# Altium schematic symbol library IC_ADI.SCHLIB: 3169 symbols (part 137 of 181) (continued)
## AD9238BCPZ-65 (continued)

## AD9238BSTZ-20
designator U?
Dual 12-Bit Analog-to-Digital Converter with Parallel Interface, 20MSPS, -40 to +85 degC, ST-64-1, Pb-Free, Tray; Generic Part Number: AD9238-20; PartNumber: AD9238BSTZ-20; Resolution (Bits): 12; Channels: 2; Throughput Rate (SPS): 20M; Interface: Par; DatasheetVersion: Rev.C; PackageVersion: 051706-A; PackageReference: ST-64-1; PackageDescription: 64-Lead Low Profile Quad Flat Package [LQFP]; Supplier Part Number 1: AD9238BSTZ-20-ND; Supplier Part Number 2: 59K7212; Supplier Part Number 3: 584-AD9238BSTZ-20; RoHS: Y; Packing: Tray; Mounting Technology: Surface Mount; Code_JEDEC: MS-026-BBD; ComponentLink1Description: Manufacturer URL; ComponentLink2Description: Datasheet; ComponentLink3Description: Package Specification; ComponentLink4Description: Product URL
footprint LQFP64_0.4MM(10X10) (Footprint not found)
part A pins: 2 VIN+_A (in) "Analog Input Pin (+) for Channel A.", 3 VIN-_A (in) "Analog Input Pin (-) for Channel A.", 6 REFT_A "Differential Reference (+) for Channel A.", 7 REFB_A "Differential Reference (-) for Channel A.", 8 VREF (io) "Voltage Reference Input/Output.", 9 SENSE (in) "Reference Mode Selection.", 10 REFB_B "Differential Reference (-) for Channel B.", 11 REFT_B "Differential Reference (+) for Channel B.", 14 VIN-_B (in) "Analog Input Pin (-) for Channel B.", 15 VIN+_B (in) "Analog Input Pin (+) for Channel B.", 18 CLK_B (in) "Clock Input Pin for Channel B.", 19 DCS (in) "Enable Duty Cycle Stabilizer (DCS) Mode (Tie High to Enable).", 20 DFS (in) "Data Output Format Select Bit (Low for Offset Binary, High for Twos Complement).", 21 PDWN_B (in) "Power-Down Function Selection for Channel B:  Logic 0 enables Channel B.  Logic 1 powers down Channel B. (Outputs static, not High-Z.)", 22 OEB_B (in) "Output Enable Bit for Channel B:  Logic 0 enables Data Bus B.  Logic 1 sets outputs to High-Z.", 23 DNC "Do Not Connect Pins. Should be left floating.", 24 DNC "Do Not Connect Pins. Should be left floating.", 25 D0_B (LSB) (hiz) "Channel B Data Output Bits.", 26 D1_B (hiz) "Channel B Data Output Bits.", 27 D2_B (hiz) "Channel B Data Output Bits.", 30 D3_B (hiz) "Channel B Data Output Bits.", 31 D4_B (hiz) "Channel B Data Output Bits.", 32 D5_B (hiz) "Channel B Data Output Bits.", 33 D6_B (hiz) "Channel B Data Output Bits.", 34 D7_B (hiz) "Channel B Data Output Bits.", 35 D8_B (hiz) "Channel B Data Output Bits.", 36 D9_B (hiz) "Channel B Data Output Bits.", 37 D10_B (hiz) "Channel A Data Output Bits.", 38 D11_B (MSB) (hiz) "Channel A Data Output Bits.", 39 OTR_B (hiz) "Out-of-Range Indicator for Channel B.", 42 DNC "Do Not Connect Pins. Should be left floating.", 43 DNC "Do Not Connect Pins. Should be left floating.", 44 D0_A (LSB) (hiz) "Channel A Data Output Bits.", 45 D1_A (hiz) "Channel A Data Output Bits.", 46 D2_A (hiz) "Channel A Data Output Bits.", 47 D3_A (hiz) "Channel A Data Output Bits.", 48 D4_A (hiz) "Channel A Data Output Bits.", 49 D5_A (hiz) "Channel A Data Output Bits.", 50 D6_A (hiz) "Channel A Data Output Bits.", 51 D7_A (hiz) "Channel A Data Output Bits.", 54 D8_A (hiz) "Channel A Data Output Bits.", 55 D9_A (hiz) "Channel A Data Output Bits.", 56 D10_A (hiz) "Channel A Data Output Bits.", 57 D11_A (MSB) (hiz) "Channel A Data Output Bits.", 58 OTR_A (hiz) "Out-of-Range Indicator for Channel A.", 59 OEB_A (in) "Output Enable Bit for Channel A:  Logic 0 enables Data Bus A.  Logic 1 sets outputs to High-Z.", 60 PDWN_A (in) "Power-Down Function Selection for Channel A:  Logic 0 enables Channel A.  Logic 1 powers down Channel A. (Outputs static, not High-Z.)", 61 MUX_SELECT (in) "Data Multiplexed Mode. (See Data Format section for how to enable; high setting disables  output data multiplexed mode).", 62 SHARED_REF (in) "Shared Reference Control Bit (Low for Independent Reference Mode, High for Shared Reference Mode).", 63 CLK_A (in) "Clock Input Pin for Channel A."
part B pins: 1 AGND (power) "Analog Ground.", 4 AGND (power) "Analog Ground.", 5 AVDD (power) "Analog Power Supply.", 12 AVDD (power) "Analog Power Supply.", 13 AGND (power) "Analog Ground.", 16 AGND (power) "Analog Ground.", 17 AVDD (power) "Analog Power Supply.", 28 DRGND (power) "Digital Output Ground.", 29 DRVDD (power) "Digital Output Driver Supply. Must be decoupled to DRGND with a minimum 0.1 uF capacitor.  Recommended decoupling is 0.1 uF capacitor in parallel with 10 uF.", 40 DRGND (power) "Digital Output Ground.", 41 DRVDD (power) "Digital Output Driver Supply. Must be decoupled to DRGND with a minimum 0.1 uF capacitor.  Recommended decoupling is 0.1 uF capacitor in parallel with 10 uF.", 52 DRVDD (power) "Digital Output Driver Supply. Must be decoupled to DRGND with a minimum 0.1 uF capacitor.   Recommended decoupling is 0.1 uF capacitor in parallel with 10 uF.", 53 DRGND (power) "Digital Output Ground.", 64 AVDD (power) "Analog Power Supply."

## AD9238BSTZ-40
designator U?
Dual 12-Bit Analog-to-Digital Converter with Parallel Interface, 40MSPS, -40 to +85 degC, ST-64-1, Pb-Free, Tray; Generic Part Number: AD9238-40; PartNumber: AD9238BSTZ-40; Resolution (Bits): 12; Channels: 2; Throughput Rate (SPS): 40M; Interface: Par; DatasheetVersion: Rev.C; PackageVersion: 051706-A; PackageReference: ST-64-1; PackageDescription: 64-Lead Low Profile Quad Flat Package [LQFP]; Supplier Part Number 1: AD9238BSTZ-40-ND; Supplier Part Number 2: 1438562; Supplier Part Number 3: 59K7214; Supplier Part Number 4: 584-AD9238BSTZ-40; RoHS: Y; Packing: Tray; Mounting Technology: Surface Mount; Code_JEDEC: MS-026-BBD; ComponentLink1Description: Manufacturer URL; ComponentLink2Description: Datasheet; ComponentLink3Description: Package Specification; ComponentLink4Description: Product URL
footprint LQFP64_0.4MM(10X10) (Footprint not found)
part A pins: 2 VIN+_A (in) "Analog Input Pin (+) for Channel A.", 3 VIN-_A (in) "Analog Input Pin (-) for Channel A.", 14 VIN-_B (in) "Analog Input Pin (-) for Channel B.", 15 VIN+_B (in) "Analog Input Pin (+) for Channel B.", 22 OEB_B (in) "Output Enable Bit for Channel B:  Logic 0 enables Data Bus B.  Logic 1 sets outputs to High-Z.", 25 D0_B (LSB) (hiz) "Channel B Data Output Bits.", 26 D1_B (hiz) "Channel B Data Output Bits.", 27 D2_B (hiz) "Channel B Data Output Bits.", 30 D3_B (hiz) "Channel B Data Output Bits.", 31 D4_B (hiz) "Channel B Data Output Bits.", 32 D5_B (hiz) "Channel B Data Output Bits.", 33 D6_B (hiz) "Channel B Data Output Bits.", 34 D7_B (hiz) "Channel B Data Output Bits.", 35 D8_B (hiz) "Channel B Data Output Bits.", 36 D9_B (hiz) "Channel B Data Output Bits.", 37 D10_B (hiz) "Channel A Data Output Bits.", 38 D11_B (MSB) (hiz) "Channel A Data Output Bits.", 39 OTR_B (hiz) "Out-of-Range Indicator for Channel B.", 44 D0_A (LSB) (hiz) "Channel A Data Output Bits.", 45 D1_A (hiz) "Channel A Data Output Bits.", 46 D2_A (hiz) "Channel A Data Output Bits.", 47 D3_A (hiz) "Channel A Data Output Bits.", 48 D4_A (hiz) "Channel A Data Output Bits.", 49 D5_A (hiz) "Channel A Data Output Bits.", 50 D6_A (hiz) "Channel A Data Output Bits.", 51 D7_A (hiz) "Channel A Data Output Bits.", 54 D8_A (hiz) "Channel A Data Output Bits.", 55 D9_A (hiz) "Channel A Data Output Bits.", 56 D10_A (hiz) "Channel A Data Output Bits.", 57 D11_A (MSB) (hiz) "Channel A Data Output Bits.", 58 OTR_A (hiz) "Out-of-Range Indicator for Channel A.", 59 OEB_A (in) "Output Enable Bit for Channel A:  Logic 0 enables Data Bus A.  Logic 1 sets outputs to High-Z."
part B pins: 6 REFT_A "Differential Reference (+) for Channel A.", 7 REFB_A "Differential Reference (-) for Channel A.", 8 VREF (io) "Voltage Reference Input/Output.", 9 SENSE (in) "Reference Mode Selection.", 10 REFB_B "Differential Reference (-) for Channel B.", 11 REFT_B "Differential Reference (+) for Channel B.", 18 CLK_B (in) "Clock Input Pin for Channel B.", 19 DCS (in) "Enable Duty Cycle Stabilizer (DCS) Mode (Tie High to Enable).", 20 DFS (in) "Data Output Format Select Bit (Low for Offset Binary, High for Twos Complement).", 21 PDWN_B (in) "Power-Down Function Selection for Channel B:  Logic 0 enables Channel B.  Logic 1 powers down Channel B. (Outputs static, not High-Z.)", 23 DNC "Do Not Connect Pins. Should be left floating.", 24 DNC "Do Not Connect Pins. Should be left floating.", 42 DNC "Do Not Connect Pins. Should be left floating.", 43 DNC "Do Not Connect Pins. Should be left floating.", 60 PDWN_A (in) "Power-Down Function Selection for Channel A:  Logic 0 enables Channel A.  Logic 1 powers down Channel A. (Outputs static, not High-Z.)", 61 MUX_SELECT (in) "Data Multiplexed Mode. (See Data Format section for how to enable; high setting disables  output data multiplexed mode).", 62 SHARED_REF (in) "Shared Reference Control Bit (Low for Independent Reference Mode, High for Shared Reference Mode).", 63 CLK_A (in) "Clock Input Pin for Channel A."
part C pins: 1 AGND (power) "Analog Ground.", 4 AGND (power) "Analog Ground.", 5 AVDD (power) "Analog Power Supply.", 12 AVDD (power) "Analog Power Supply.", 13 AGND (power) "Analog Ground.", 16 AGND (power) "Analog Ground.", 17 AVDD (power) "Analog Power Supply.", 28 DRGND (power) "Digital Output Ground.", 29 DRVDD (power) "Digital Output Driver Supply. Must be decoupled to DRGND with a minimum 0.1 礔 capacitor.  Recommended decoupling is 0.1 礔 capacitor in parallel with 10 礔.", 40 DRGND (power) "Digital Output Ground.", 41 DRVDD (power) "Digital Output Driver Supply. Must be decoupled to DRGND with a minimum 0.1 礔 capacitor.  Recommended decoupling is 0.1 礔 capacitor in parallel with 10 礔.", 52 DRVDD (power) "Digital Output Driver Supply. Must be decoupled to DRGND with a minimum 0.1 礔 capacitor.   Recommended decoupling is 0.1 礔 capacitor in parallel with 10 礔.", 53 DRGND (power) "Digital Output Ground.", 64 AVDD (power) "Analog Power Supply."

## AD9238BSTZ-65
designator U?
Dual 12-Bit Analog-to-Digital Converter with Parallel Interface, 65MSPS, -40 to +85 degC, ST-64-1, Pb-Free, Tray; Generic Part Number: AD9238-65; PartNumber: AD9238BSTZ-65; Resolution (Bits): 12; Channels: 2; Throughput Rate (SPS): 65M; Interface: Par; DatasheetVersion: Rev.C; PackageVersion: 051706-A; PackageReference: ST-64-1; PackageDescription: 64-Lead Low Profile Quad Flat Package [LQFP]; Supplier Part Number 1: AD9238BSTZ-65-ND; Supplier Part Number 2: 1581964; Supplier Part Number 3: 59K7216; Supplier Part Number 4: 584-AD9238BSTZ-65; RoHS: Y; Packing: Tray; Mounting Technology: Surface Mount; Code_JEDEC: MS-026-BBD; ComponentLink1Description: Manufacturer URL; ComponentLink2Description: Datasheet; ComponentLink3Description: Package Specification; ComponentLink4Description: Product URL
footprint LQFP64_0.4MM(10X10) (Footprint not found)
part A pins: 2 VIN+_A (in) "Analog Input Pin (+) for Channel A.", 3 VIN-_A (in) "Analog Input Pin (-) for Channel A.", 14 VIN-_B (in) "Analog Input Pin (-) for Channel B.", 15 VIN+_B (in) "Analog Input Pin (+) for Channel B.", 22 OEB_B (in) "Output Enable Bit for Channel B:  Logic 0 enables Data Bus B.  Logic 1 sets outputs to High-Z.", 25 D0_B (LSB) (hiz) "Channel B Data Output Bits.", 26 D1_B (hiz) "Channel B Data Output Bits.", 27 D2_B (hiz) "Channel B Data Output Bits.", 30 D3_B (hiz) "Channel B Data Output Bits.", 31 D4_B (hiz) "Channel B Data Output Bits.", 32 D5_B (hiz) "Channel B Data Output Bits.", 33 D6_B (hiz) "Channel B Data Output Bits.", 34 D7_B (hiz) "Channel B Data Output Bits.", 35 D8_B (hiz) "Channel B Data Output Bits.", 36 D9_B (hiz) "Channel B Data Output Bits.", 37 D10_B (hiz) "Channel A Data Output Bits.", 38 D11_B (MSB) (hiz) "Channel A Data Output Bits.", 39 OTR_B (hiz) "Out-of-Range Indicator for Channel B.", 44 D0_A (LSB) (hiz) "Channel A Data Output Bits.", 45 D1_A (hiz) "Channel A Data Output Bits.", 46 D2_A (hiz) "Channel A Data Output Bits.", 47 D3_A (hiz) "Channel A Data Output Bits.", 48 D4_A (hiz) "Channel A Data Output Bits.", 49 D5_A (hiz) "Channel A Data Output Bits.", 50 D6_A (hiz) "Channel A Data Output Bits.", 51 D7_A (hiz) "Channel A Data Output Bits.", 54 D8_A (hiz) "Channel A Data Output Bits.", 55 D9_A (hiz) "Channel A Data Output Bits.", 56 D10_A (hiz) "Channel A Data Output Bits.", 57 D11_A (MSB) (hiz) "Channel A Data Output Bits.", 58 OTR_A (hiz) "Out-of-Range Indicator for Channel A.", 59 OEB_A (in) "Output Enable Bit for Channel A:  Logic 0 enables Data Bus A.  Logic 1 sets outputs to High-Z."
part B pins: 1 AGND (power) "Analog Ground.", 4 AGND (power) "Analog Ground.", 5 AVDD (power) "Analog Power Supply.", 6 REFT_A "Differential Reference (+) for Channel A.", 7 REFB_A "Differential Reference (-) for Channel A.", 8 VREF (io) "Voltage Reference Input/Output.", 9 SENSE (in) "Reference Mode Selection.", 10 REFB_B "Differential Reference (-) for Channel B.", 11 REFT_B "Differential Reference (+) for Channel B.", 12 AVDD (power) "Analog Power Supply.", 13 AGND (power) "Analog Ground.", 16 AGND (power) "Analog Ground.", 17 AVDD (power) "Analog Power Supply.", 18 CLK_B (in) "Clock Input Pin for Channel B.", 19 DCS (in) "Enable Duty Cycle Stabilizer (DCS) Mode (Tie High to Enable).", 20 DFS (in) "Data Output Format Select Bit (Low for Offset Binary, High for Twos Complement).", 21 PDWN_B (in) "Power-Down Function Selection for Channel B:  Logic 0 enables Channel B.  Logic 1 powers down Channel B. (Outputs static, not High-Z.)", 23 DNC "Do Not Connect Pins. Should be left floating.", 24 DNC "Do Not Connect Pins. Should be left floating.", 28 DRGND (power) "Digital Output Ground.", 29 DRVDD (power) "Digital Output Driver Supply. Must be decoupled to DRGND with a minimum 0.1 礔 capacitor.  Recommended decoupling is 0.1 礔 capacitor in parallel with 10 礔.", 40 DRGND (power) "Digital Output Ground.", 41 DRVDD (power) "Digital Output Driver Supply. Must be decoupled to DRGND with a minimum 0.1 礔 capacitor.  Recommended decoupling is 0.1 礔 capacitor in parallel with 10 礔.", 42 DNC "Do Not Connect Pins. Should be left floating.", 43 DNC "Do Not Connect Pins. Should be left floating.", 52 DRVDD (power) "Digital Output Driver Supply. Must be decoupled to DRGND with a minimum 0.1 礔 capacitor.   Recommended decoupling is 0.1 礔 capacitor in parallel with 10 礔.", 53 DRGND (power) "Digital Output Ground.", 60 PDWN_A (in) "Power-Down Function Selection for Channel A:  Logic 0 enables Channel A.  Logic 1 powers down Channel A. (Outputs static, not High-Z.)", 61 MUX_SELECT (in) "Data Multiplexed Mode. (See Data Format section for how to enable; high setting disables  output data multiplexed mode).", 62 SHARED_REF (in) "Shared Reference Control Bit (Low for Independent Reference Mode, High for Shared Reference Mode).", 63 CLK_A (in) "Clock Input Pin for Channel A.", 64 AVDD (power) "Analog Power Supply."

## AD9238BSTZRL-20
designator U?
Dual 12-Bit Analog-to-Digital Converter with Parallel Interface, 20MSPS, -40 to +85 degC, ST-64-1, Pb-Free, Reel; Generic Part Number: AD9238-20; PartNumber: AD9238BSTZRL-20; Resolution (Bits): 12; Channels: 2; Throughput Rate (SPS): 20M; Interface: Par; DatasheetVersion: Rev.C; PackageVersion: 051706-A; PackageReference: ST-64-1; PackageDescription: 64-Lead Low Profile Quad Flat Package [LQFP]; Supplier Part Number 1: AD9238BSTZRL-20-ND; Supplier Part Number 2: 584-AD9238BSTZR-20; RoHS: Y; Packing: Reel; Mounting Technology: Surface Mount; Code_JEDEC: MS-026-BBD; ComponentLink1Description: Manufacturer URL; ComponentLink2Description: Datasheet; ComponentLink3Description: Package Specification; ComponentLink4Description: Product URL
footprint LQFP64_0.4MM(10X10) (Footprint not found)
part A pins: 2 VIN+_A (in) "Analog Input Pin (+) for Channel A.", 3 VIN-_A (in) "Analog Input Pin (-) for Channel A.", 6 REFT_A "Differential Reference (+) for Channel A.", 7 REFB_A "Differential Reference (-) for Channel A.", 8 VREF (io) "Voltage Reference Input/Output.", 9 SENSE (in) "Reference Mode Selection.", 10 REFB_B "Differential Reference (-) for Channel B.", 11 REFT_B "Differential Reference (+) for Channel B.", 14 VIN-_B (in) "Analog Input Pin (-) for Channel B.", 15 VIN+_B (in) "Analog Input Pin (+) for Channel B.", 18 CLK_B (in) "Clock Input Pin for Channel B.", 19 DCS (in) "Enable Duty Cycle Stabilizer (DCS) Mode (Tie High to Enable).", 20 DFS (in) "Data Output Format Select Bit (Low for Offset Binary, High for Twos Complement).", 21 PDWN_B (in) "Power-Down Function Selection for Channel B:  Logic 0 enables Channel B.  Logic 1 powers down Channel B. (Outputs static, not High-Z.)", 22 OEB_B (in) "Output Enable Bit for Channel B:  Logic 0 enables Data Bus B.  Logic 1 sets outputs to High-Z.", 23 DNC "Do Not Connect Pins. Should be left floating.", 24 DNC "Do Not Connect Pins. Should be left floating.", 25 D0_B (LSB) (hiz) "Channel B Data Output Bits.", 26 D1_B (hiz) "Channel B Data Output Bits.", 27 D2_B (hiz) "Channel B Data Output Bits.", 30 D3_B (hiz) "Channel B Data Output Bits.", 31 D4_B (hiz) "Channel B Data Output Bits.", 32 D5_B (hiz) "Channel B Data Output Bits.", 33 D6_B (hiz) "Channel B Data Output Bits.", 34 D7_B (hiz) "Channel B Data Output Bits.", 35 D8_B (hiz) "Channel B Data Output Bits.", 36 D9_B (hiz) "Channel B Data Output Bits.", 37 D10_B (hiz) "Channel A Data Output Bits.", 38 D11_B (MSB) (hiz) "Channel A Data Output Bits.", 39 OTR_B (hiz) "Out-of-Range Indicator for Channel B.", 42 DNC "Do Not Connect Pins. Should be left floating.", 43 DNC "Do Not Connect Pins. Should be left floating.", 44 D0_A (LSB) (hiz) "Channel A Data Output Bits.", 45 D1_A (hiz) "Channel A Data Output Bits.", 46 D2_A (hiz) "Channel A Data Output Bits.", 47 D3_A (hiz) "Channel A Data Output Bits.", 48 D4_A (hiz) "Channel A Data Output Bits.", 49 D5_A (hiz) "Channel A Data Output Bits.", 50 D6_A (hiz) "Channel A Data Output Bits.", 51 D7_A (hiz) "Channel A Data Output Bits.", 54 D8_A (hiz) "Channel A Data Output Bits.", 55 D9_A (hiz) "Channel A Data Output Bits.", 56 D10_A (hiz) "Channel A Data Output Bits.", 57 D11_A (MSB) (hiz) "Channel A Data Output Bits.", 58 OTR_A (hiz) "Out-of-Range Indicator for Channel A.", 59 OEB_A (in) "Output Enable Bit for Channel A:  Logic 0 enables Data Bus A.  Logic 1 sets outputs to High-Z.", 60 PDWN_A (in) "Power-Down Function Selection for Channel A:  Logic 0 enables Channel A.  Logic 1 powers down Channel A. (Outputs static, not High-Z.)", 61 MUX_SELECT (in) "Data Multiplexed Mode. (See Data Format section for how to enable; high setting disables  output data multiplexed mode).", 62 SHARED_REF (in) "Shared Reference Control Bit (Low for Independent Reference Mode, High for Shared Reference Mode).", 63 CLK_A (in) "Clock Input Pin for Channel A."
part B pins: 1 AGND (power) "Analog Ground.", 4 AGND (power) "Analog Ground.", 5 AVDD (power) "Analog Power Supply.", 12 AVDD (power) "Analog Power Supply.", 13 AGND (power) "Analog Ground.", 16 AGND (power) "Analog Ground.", 17 AVDD (power) "Analog Power Supply.", 28 DRGND (power) "Digital Output Ground.", 29 DRVDD (power) "Digital Output Driver Supply. Must be decoupled to DRGND with a minimum 0.1 uF capacitor.  Recommended decoupling is 0.1 uF capacitor in parallel with 10 uF.", 40 DRGND (power) "Digital Output Ground.", 41 DRVDD (power) "Digital Output Driver Supply. Must be decoupled to DRGND with a minimum 0.1 uF capacitor.  Recommended decoupling is 0.1 uF capacitor in parallel with 10 uF.", 52 DRVDD (power) "Digital Output Driver Supply. Must be decoupled to DRGND with a minimum 0.1 uF capacitor.   Recommended decoupling is 0.1 uF capacitor in parallel with 10 uF.", 53 DRGND (power) "Digital Output Ground.", 64 AVDD (power) "Analog Power Supply."

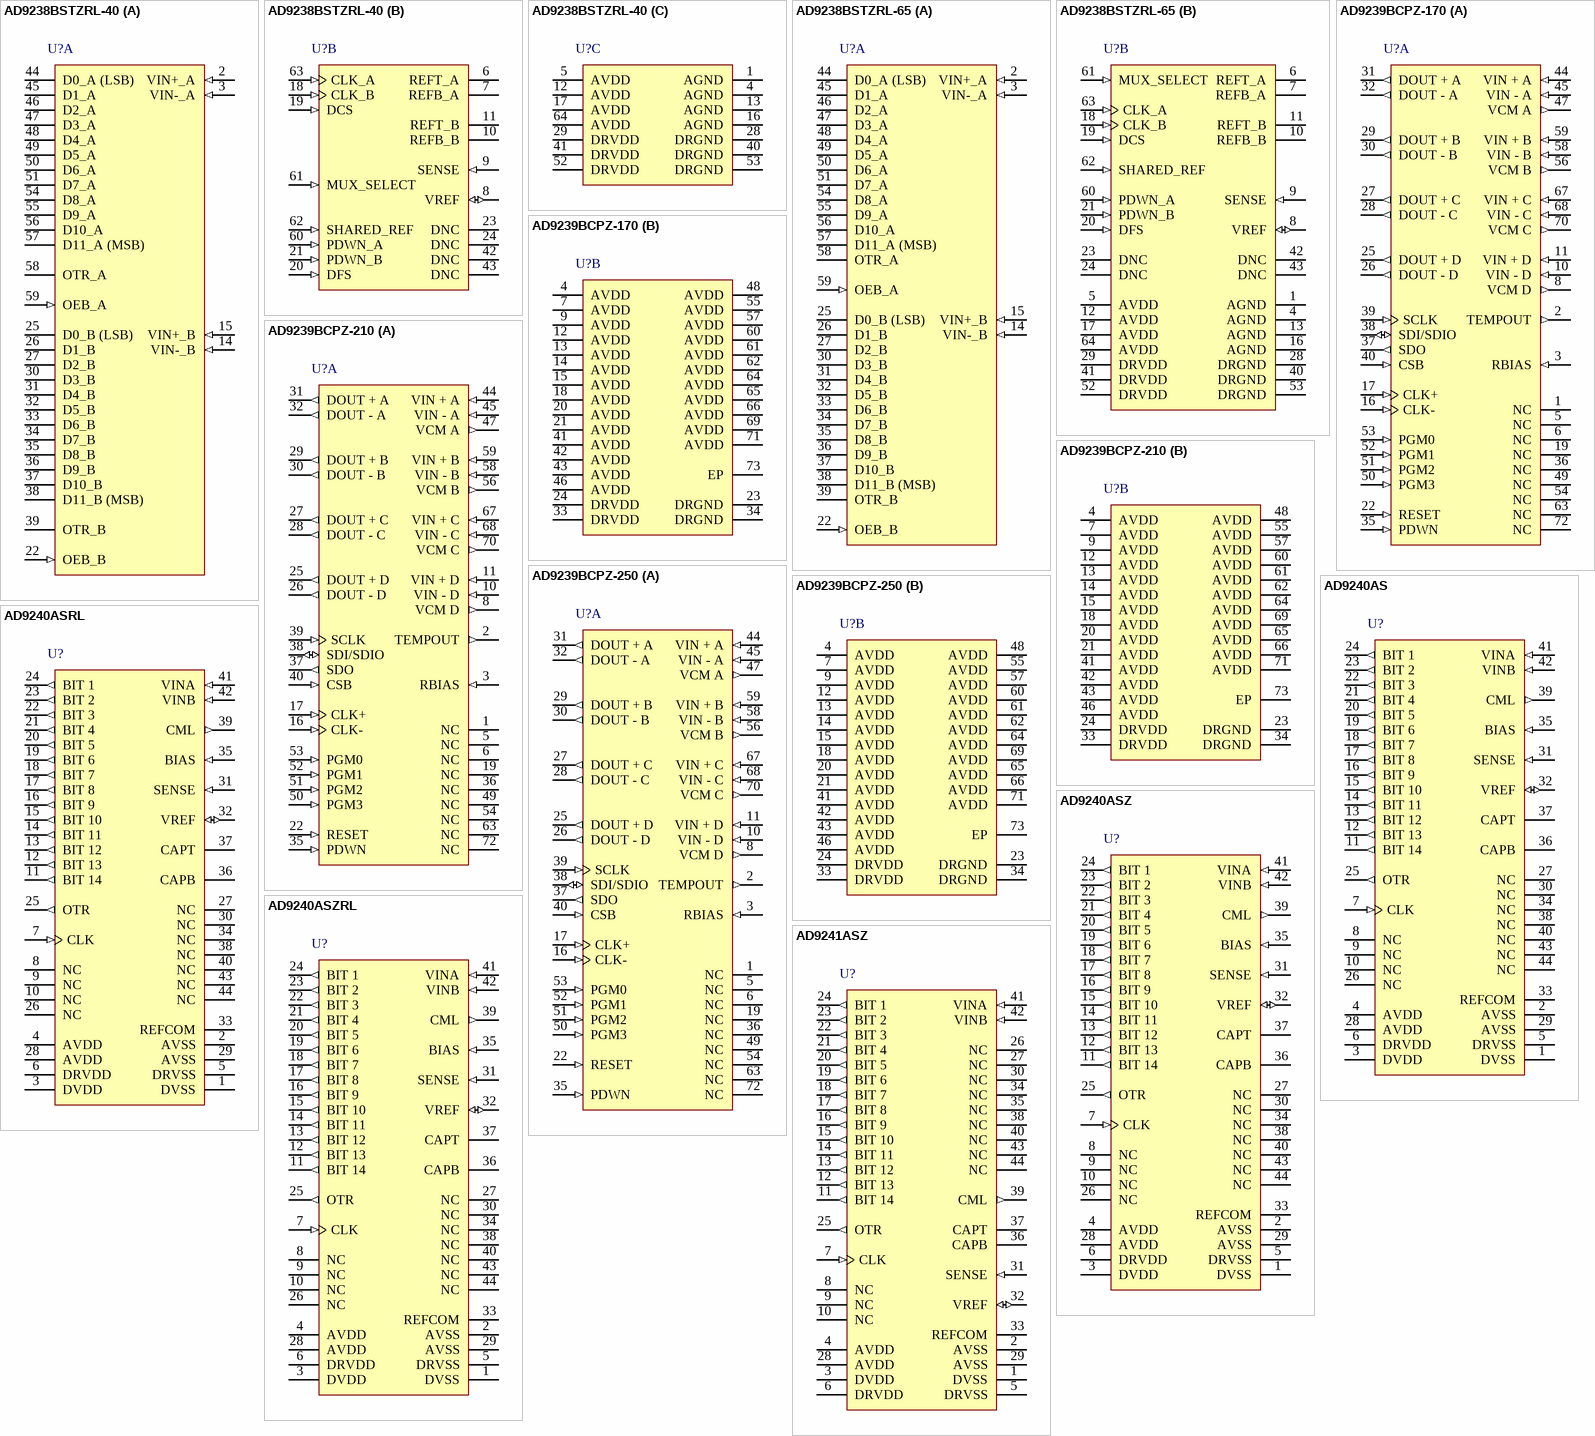
[diagram p113: symbols AD9238BSTZRL-40 to AD9241ASZ]

## AD9238BSTZRL-40
designator U?
Dual 12-Bit Analog-to-Digital Converter with Parallel Interface, 40MSPS, -40 to +85 degC, ST-64-1, Pb-Free,Reel; Generic Part Number: AD9238-40; PartNumber: AD9238BSTZRL-40; Resolution (Bits): 12; Channels: 2; Throughput Rate (SPS): 40M; Interface: Par; DatasheetVersion: Rev.C; PackageVersion: 051706-A; PackageReference: ST-64-1; PackageDescription: 64-Lead Low Profile Quad Flat Package [LQFP]; Supplier Part Number 1: AD9238BSTZRL-40-ND; Supplier Part Number 2: 584-AD9238BSTZR-40; RoHS: Y; Packing: Reel; Mounting Technology: Surface Mount; Code_JEDEC: MS-026-BBD; ComponentLink1Description: Manufacturer URL; ComponentLink2Description: Datasheet; ComponentLink3Description: Package Specification; ComponentLink4Description: Product URL
footprint LQFP64_0.4MM(10X10) (Footprint not found)
part A pins: 2 VIN+_A (in) "Analog Input Pin (+) for Channel A.", 3 VIN-_A (in) "Analog Input Pin (-) for Channel A.", 14 VIN-_B (in) "Analog Input Pin (-) for Channel B.", 15 VIN+_B (in) "Analog Input Pin (+) for Channel B.", 22 OEB_B (in) "Output Enable Bit for Channel B:  Logic 0 enables Data Bus B.  Logic 1 sets outputs to High-Z.", 25 D0_B (LSB) (hiz) "Channel B Data Output Bits.", 26 D1_B (hiz) "Channel B Data Output Bits.", 27 D2_B (hiz) "Channel B Data Output Bits.", 30 D3_B (hiz) "Channel B Data Output Bits.", 31 D4_B (hiz) "Channel B Data Output Bits.", 32 D5_B (hiz) "Channel B Data Output Bits.", 33 D6_B (hiz) "Channel B Data Output Bits.", 34 D7_B (hiz) "Channel B Data Output Bits.", 35 D8_B (hiz) "Channel B Data Output Bits.", 36 D9_B (hiz) "Channel B Data Output Bits.", 37 D10_B (hiz) "Channel A Data Output Bits.", 38 D11_B (MSB) (hiz) "Channel A Data Output Bits.", 39 OTR_B (hiz) "Out-of-Range Indicator for Channel B.", 44 D0_A (LSB) (hiz) "Channel A Data Output Bits.", 45 D1_A (hiz) "Channel A Data Output Bits.", 46 D2_A (hiz) "Channel A Data Output Bits.", 47 D3_A (hiz) "Channel A Data Output Bits.", 48 D4_A (hiz) "Channel A Data Output Bits.", 49 D5_A (hiz) "Channel A Data Output Bits.", 50 D6_A (hiz) "Channel A Data Output Bits.", 51 D7_A (hiz) "Channel A Data Output Bits.", 54 D8_A (hiz) "Channel A Data Output Bits.", 55 D9_A (hiz) "Channel A Data Output Bits.", 56 D10_A (hiz) "Channel A Data Output Bits.", 57 D11_A (MSB) (hiz) "Channel A Data Output Bits.", 58 OTR_A (hiz) "Out-of-Range Indicator for Channel A.", 59 OEB_A (in) "Output Enable Bit for Channel A:  Logic 0 enables Data Bus A.  Logic 1 sets outputs to High-Z."
part B pins: 6 REFT_A "Differential Reference (+) for Channel A.", 7 REFB_A "Differential Reference (-) for Channel A.", 8 VREF (io) "Voltage Reference Input/Output.", 9 SENSE (in) "Reference Mode Selection.", 10 REFB_B "Differential Reference (-) for Channel B.", 11 REFT_B "Differential Reference (+) for Channel B.", 18 CLK_B (in) "Clock Input Pin for Channel B.", 19 DCS (in) "Enable Duty Cycle Stabilizer (DCS) Mode (Tie High to Enable).", 20 DFS (in) "Data Output Format Select Bit (Low for Offset Binary, High for Twos Complement).", 21 PDWN_B (in) "Power-Down Function Selection for Channel B:  Logic 0 enables Channel B.  Logic 1 powers down Channel B. (Outputs static, not High-Z.)", 23 DNC "Do Not Connect Pins. Should be left floating.", 24 DNC "Do Not Connect Pins. Should be left floating.", 42 DNC "Do Not Connect Pins. Should be left floating.", 43 DNC "Do Not Connect Pins. Should be left floating.", 60 PDWN_A (in) "Power-Down Function Selection for Channel A:  Logic 0 enables Channel A.  Logic 1 powers down Channel A. (Outputs static, not High-Z.)", 61 MUX_SELECT (in) "Data Multiplexed Mode. (See Data Format section for how to enable; high setting disables  output data multiplexed mode).", 62 SHARED_REF (in) "Shared Reference Control Bit (Low for Independent Reference Mode, High for Shared Reference Mode).", 63 CLK_A (in) "Clock Input Pin for Channel A."
part C pins: 1 AGND (power) "Analog Ground.", 4 AGND (power) "Analog Ground.", 5 AVDD (power) "Analog Power Supply.", 12 AVDD (power) "Analog Power Supply.", 13 AGND (power) "Analog Ground.", 16 AGND (power) "Analog Ground.", 17 AVDD (power) "Analog Power Supply.", 28 DRGND (power) "Digital Output Ground.", 29 DRVDD (power) "Digital Output Driver Supply. Must be decoupled to DRGND with a minimum 0.1 礔 capacitor.  Recommended decoupling is 0.1 礔 capacitor in parallel with 10 礔.", 40 DRGND (power) "Digital Output Ground.", 41 DRVDD (power) "Digital Output Driver Supply. Must be decoupled to DRGND with a minimum 0.1 礔 capacitor.  Recommended decoupling is 0.1 礔 capacitor in parallel with 10 礔.", 52 DRVDD (power) "Digital Output Driver Supply. Must be decoupled to DRGND with a minimum 0.1 礔 capacitor.   Recommended decoupling is 0.1 礔 capacitor in parallel with 10 礔.", 53 DRGND (power) "Digital Output Ground.", 64 AVDD (power) "Analog Power Supply."

## AD9238BSTZRL-65
designator U?
Dual 12-Bit Analog-to-Digital Converter with Parallel Interface, 65MSPS, -40 to +85 degC, ST-64-1, Pb-Free, Reel; Generic Part Number: AD9238-65; PartNumber: AD9238BSTZRL-65; Resolution (Bits): 12; Channels: 2; Throughput Rate (SPS): 65M; Interface: Par; DatasheetVersion: Rev.C; PackageVersion: 051706-A; PackageReference: ST-64-1; PackageDescription: 64-Lead Low Profile Quad Flat Package [LQFP]; Supplier Part Number 1: AD9238BSTZRL-65-ND; Supplier Part Number 2: 584-AD9238BSTZR-65; RoHS: Y; Packing: Reel; Mounting Technology: Surface Mount; Code_JEDEC: MS-026-BBD; ComponentLink1Description: Manufacturer URL; ComponentLink2Description: Datasheet; ComponentLink3Description: Package Specification; ComponentLink4Description: Product URL
footprint LQFP64_0.4MM(10X10) (Footprint not found)
part A pins: 2 VIN+_A (in) "Analog Input Pin (+) for Channel A.", 3 VIN-_A (in) "Analog Input Pin (-) for Channel A.", 14 VIN-_B (in) "Analog Input Pin (-) for Channel B.", 15 VIN+_B (in) "Analog Input Pin (+) for Channel B.", 22 OEB_B (in) "Output Enable Bit for Channel B:  Logic 0 enables Data Bus B.  Logic 1 sets outputs to High-Z.", 25 D0_B (LSB) (hiz) "Channel B Data Output Bits.", 26 D1_B (hiz) "Channel B Data Output Bits.", 27 D2_B (hiz) "Channel B Data Output Bits.", 30 D3_B (hiz) "Channel B Data Output Bits.", 31 D4_B (hiz) "Channel B Data Output Bits.", 32 D5_B (hiz) "Channel B Data Output Bits.", 33 D6_B (hiz) "Channel B Data Output Bits.", 34 D7_B (hiz) "Channel B Data Output Bits.", 35 D8_B (hiz) "Channel B Data Output Bits.", 36 D9_B (hiz) "Channel B Data Output Bits.", 37 D10_B (hiz) "Channel A Data Output Bits.", 38 D11_B (MSB) (hiz) "Channel A Data Output Bits.", 39 OTR_B (hiz) "Out-of-Range Indicator for Channel B.", 44 D0_A (LSB) (hiz) "Channel A Data Output Bits.", 45 D1_A (hiz) "Channel A Data Output Bits.", 46 D2_A (hiz) "Channel A Data Output Bits.", 47 D3_A (hiz) "Channel A Data Output Bits.", 48 D4_A (hiz) "Channel A Data Output Bits.", 49 D5_A (hiz) "Channel A Data Output Bits.", 50 D6_A (hiz) "Channel A Data Output Bits.", 51 D7_A (hiz) "Channel A Data Output Bits.", 54 D8_A (hiz) "Channel A Data Output Bits.", 55 D9_A (hiz) "Channel A Data Output Bits.", 56 D10_A (hiz) "Channel A Data Output Bits.", 57 D11_A (MSB) (hiz) "Channel A Data Output Bits.", 58 OTR_A (hiz) "Out-of-Range Indicator for Channel A.", 59 OEB_A (in) "Output Enable Bit for Channel A:  Logic 0 enables Data Bus A.  Logic 1 sets outputs to High-Z."
part B pins: 1 AGND (power) "Analog Ground.", 4 AGND (power) "Analog Ground.", 5 AVDD (power) "Analog Power Supply.", 6 REFT_A "Differential Reference (+) for Channel A.", 7 REFB_A "Differential Reference (-) for Channel A.", 8 VREF (io) "Voltage Reference Input/Output.", 9 SENSE (in) "Reference Mode Selection.", 10 REFB_B "Differential Reference (-) for Channel B.", 11 REFT_B "Differential Reference (+) for Channel B.", 12 AVDD (power) "Analog Power Supply.", 13 AGND (power) "Analog Ground.", 16 AGND (power) "Analog Ground.", 17 AVDD (power) "Analog Power Supply.", 18 CLK_B (in) "Clock Input Pin for Channel B.", 19 DCS (in) "Enable Duty Cycle Stabilizer (DCS) Mode (Tie High to Enable).", 20 DFS (in) "Data Output Format Select Bit (Low for Offset Binary, High for Twos Complement).", 21 PDWN_B (in) "Power-Down Function Selection for Channel B:  Logic 0 enables Channel B.  Logic 1 powers down Channel B. (Outputs static, not High-Z.)", 23 DNC "Do Not Connect Pins. Should be left floating.", 24 DNC "Do Not Connect Pins. Should be left floating.", 28 DRGND (power) "Digital Output Ground.", 29 DRVDD (power) "Digital Output Driver Supply. Must be decoupled to DRGND with a minimum 0.1 礔 capacitor.  Recommended decoupling is 0.1 礔 capacitor in parallel with 10 礔.", 40 DRGND (power) "Digital Output Ground.", 41 DRVDD (power) "Digital Output Driver Supply. Must be decoupled to DRGND with a minimum 0.1 礔 capacitor.  Recommended decoupling is 0.1 礔 capacitor in parallel with 10 礔.", 42 DNC "Do Not Connect Pins. Should be left floating.", 43 DNC "Do Not Connect Pins. Should be left floating.", 52 DRVDD (power) "Digital Output Driver Supply. Must be decoupled to DRGND with a minimum 0.1 礔 capacitor.   Recommended decoupling is 0.1 礔 capacitor in parallel with 10 礔.", 53 DRGND (power) "Digital Output Ground.", 60 PDWN_A (in) "Power-Down Function Selection for Channel A:  Logic 0 enables Channel A.  Logic 1 powers down Channel A. (Outputs static, not High-Z.)", 61 MUX_SELECT (in) "Data Multiplexed Mode. (See Data Format section for how to enable; high setting disables  output data multiplexed mode).", 62 SHARED_REF (in) "Shared Reference Control Bit (Low for Independent Reference Mode, High for Shared Reference Mode).", 63 CLK_A (in) "Clock Input Pin for Channel A.", 64 AVDD (power) "Analog Power Supply."